# Altium integrated library Altium_WCAP-ATUL_rev19a.IntLib: 117 symbols
Pins are listed as number, name and electrical type; pins without a type are passive.

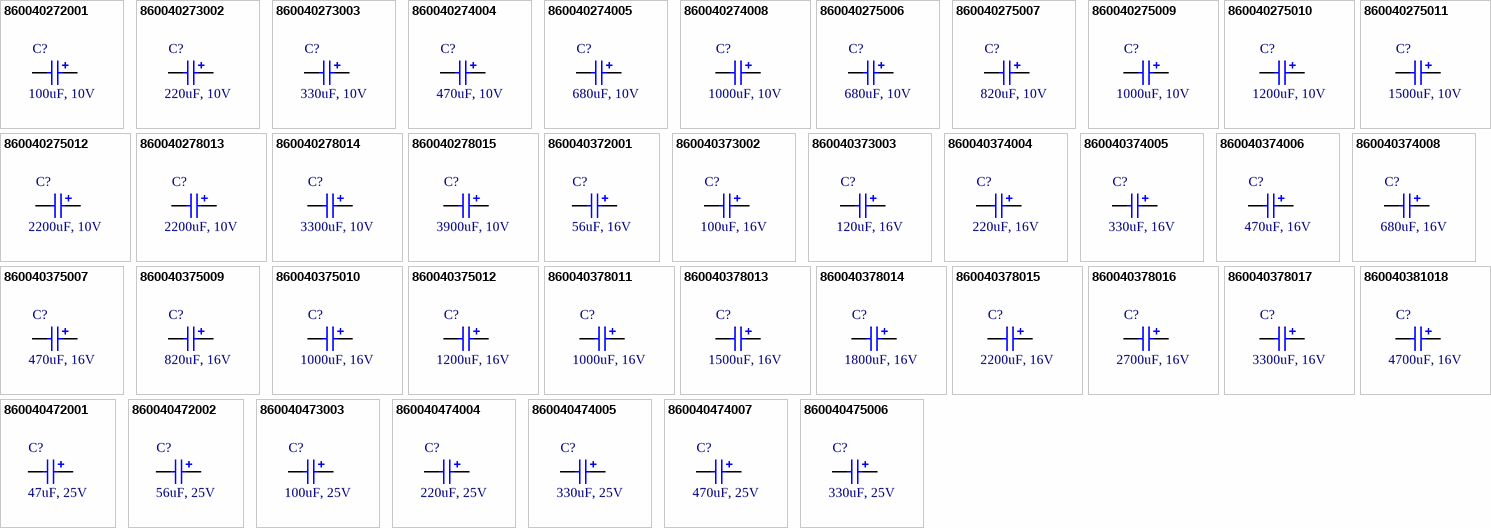
[diagram p0: symbols 860040272001 to 860040475006]

## 860040272001
designator C?, comment 100uF, 10V
WCAP-ATUL THT Aluminum Electrolytic Capacitors, D5mm x L11mm, 100uF, +/-20%, 10VDC; Part Number: 860040272001; Dissipation Factor: 19%; Endurance: 4000h; Leakage Current: 10uA; Ripple Current max.: 215mA; Technical Reference: ATDC110101M010DSPA3D000; ComponentLink1Description: Manufacturer; ComponentLink1URL: http://www.we-online.de; ComponentLink2Description: Datasheet; ComponentLink2URL: https://katalog.we-online.com/pbs/datasheet/860040272001.pdf; Length: 11mm; Mounting Technology: THT; Operating Temperature: -40 to +105degC; Packaging: Ammo Pack; Published Date: August 2019; Capacitance: 100uF; Diameter: 5mm; Publisher: Wurth Elektronik; Capacitance Tolerance: +/-20%; Rated Voltage: 10VDC
footprint WCAP-ATUL_5x11
pins: 1 N, 2 P

## 860040273002
designator C?, comment 220uF, 10V
WCAP-ATUL THT Aluminum Electrolytic Capacitors, D6.3mm x L11mm, 220uF, +/-20%, 10VDC; Part Number: 860040273002; Dissipation Factor: 19%; Endurance: 4000h; Leakage Current: 22uA; Ripple Current max.: 340mA; Technical Reference: ATDD110221M010DSPA4D000; ComponentLink1Description: Manufacturer; ComponentLink1URL: http://www.we-online.de; ComponentLink2Description: Datasheet; ComponentLink2URL: https://katalog.we-online.com/pbs/datasheet/860040273002.pdf; Length: 11mm; Mounting Technology: THT; Operating Temperature: -40 to +105degC; Packaging: Ammo Pack; Published Date: August 2019; Capacitance: 220uF; Diameter: 6.3mm; Publisher: Wurth Elektronik; Capacitance Tolerance: +/-20%; Rated Voltage: 10VDC
footprint WCAP-ATUL_6.3x11
pins: 1 N, 2 P

## 860040273003
designator C?, comment 330uF, 10V
WCAP-ATUL THT Aluminum Electrolytic Capacitors, D6.3mm x L11mm, 330uF, +/-20%, 10VDC; Part Number: 860040273003; Dissipation Factor: 19%; Endurance: 4000h; Leakage Current: 33uA; Ripple Current max.: 380mA; Technical Reference: ATDD110331M010DSPA4D000; ComponentLink1Description: Manufacturer; ComponentLink1URL: http://www.we-online.de; ComponentLink2Description: Datasheet; ComponentLink2URL: https://katalog.we-online.com/pbs/datasheet/860040273003.pdf; Length: 11mm; Mounting Technology: THT; Operating Temperature: -40 to +105degC; Packaging: Ammo Pack; Published Date: August 2019; Capacitance: 330uF; Diameter: 6.3mm; Publisher: Wurth Elektronik; Capacitance Tolerance: +/-20%; Rated Voltage: 10VDC
footprint WCAP-ATUL_6.3x11
pins: 1 N, 2 P

## 860040274004
designator C?, comment 470uF, 10V
WCAP-ATUL THT Aluminum Electrolytic Capacitors, D8mm x L11.5mm, 470uF, +/-20%, 10VDC; Part Number: 860040274004; Dissipation Factor: 19%; Endurance: 6000h; Leakage Current: 47uA; Ripple Current max.: 600mA; Technical Reference: ATDE115471M010DSPA7F000; ComponentLink1Description: Manufacturer; ComponentLink1URL: http://www.we-online.de; ComponentLink2Description: Datasheet; ComponentLink2URL: https://katalog.we-online.com/pbs/datasheet/860040274004.pdf; Length: 11.5mm; Mounting Technology: THT; Operating Temperature: -40 to +105degC; Packaging: Ammo Pack; Published Date: August 2019; Capacitance: 470uF; Diameter: 8mm; Publisher: Wurth Elektronik; Capacitance Tolerance: +/-20%; Rated Voltage: 10VDC
footprint WCAP-ATUL_8x11.5
pins: 1 N, 2 P

## 860040274005
designator C?, comment 680uF, 10V
WCAP-ATUL THT Aluminum Electrolytic Capacitors, D8mm x L16mm, 680uF, +/-20%, 10VDC; Part Number: 860040274005; Dissipation Factor: 19%; Endurance: 6000h; Leakage Current: 68uA; Ripple Current max.: 770mA; Technical Reference: ATDE160681M010DSPA7F000; ComponentLink1Description: Manufacturer; ComponentLink1URL: http://www.we-online.de; ComponentLink2Description: Datasheet; ComponentLink2URL: https://katalog.we-online.com/pbs/datasheet/860040274005.pdf; Length: 16mm; Mounting Technology: THT; Operating Temperature: -40 to +105degC; Packaging: Ammo Pack; Published Date: August 2019; Capacitance: 680uF; Diameter: 8mm; Publisher: Wurth Elektronik; Capacitance Tolerance: +/-20%; Rated Voltage: 10VDC
footprint WCAP-ATUL_8x16
pins: 1 N, 2 P

## 860040274008
designator C?, comment 1000uF, 10V
WCAP-ATUL THT Aluminum Electrolytic Capacitors, D8mm x L20mm, 1000uF, +/-20%, 10VDC; Part Number: 860040274008; Dissipation Factor: 19%; Endurance: 6000h; Leakage Current: 100uA; Ripple Current max.: 1050mA; Technical Reference: ATDE200102M010DSPA7F000; ComponentLink1Description: Manufacturer; ComponentLink1URL: http://www.we-online.de; ComponentLink2Description: Datasheet; ComponentLink2URL: https://katalog.we-online.com/pbs/datasheet/860040274008.pdf; Length: 20mm; Mounting Technology: THT; Operating Temperature: -40 to +105degC; Packaging: Ammo Pack; Published Date: August 2019; Capacitance: 1000uF; Diameter: 8mm; Publisher: Wurth Elektronik; Capacitance Tolerance: +/-20%; Rated Voltage: 10VDC
footprint WCAP-ATUL_8x20
pins: 1 N, 2 P

## 860040275006
designator C?, comment 680uF, 10V
WCAP-ATUL THT Aluminum Electrolytic Capacitors, D10mm x L12.5mm, 680uF, +/-20%, 10VDC; Part Number: 860040275006; Dissipation Factor: 19%; Endurance: 6000h; Leakage Current: 68uA; Ripple Current max.: 800mA; Technical Reference: ATDF125681M010DSPA9F000; ComponentLink1Description: Manufacturer; ComponentLink1URL: http://www.we-online.de; ComponentLink2Description: Datasheet; ComponentLink2URL: https://katalog.we-online.com/pbs/datasheet/860040275006.pdf; Length: 12.5mm; Mounting Technology: THT; Operating Temperature: -40 to +105degC; Packaging: Ammo Pack; Published Date: August 2019; Capacitance: 680uF; Diameter: 10mm; Publisher: Wurth Elektronik; Capacitance Tolerance: +/-20%; Rated Voltage: 10VDC
footprint WCAP-ATUL_10x12.5
pins: 1 N, 2 P

## 860040275007
designator C?, comment 820uF, 10V
WCAP-ATUL THT Aluminum Electrolytic Capacitors, D10mm x L16mm, 820uF, +/-20%, 10VDC; Part Number: 860040275007; Dissipation Factor: 19%; Endurance: 6000h; Leakage Current: 82uA; Ripple Current max.: 920mA; Technical Reference: ATDF160821M010DSPAAF000; ComponentLink1Description: Manufacturer; ComponentLink1URL: http://www.we-online.de; ComponentLink2Description: Datasheet; ComponentLink2URL: https://katalog.we-online.com/pbs/datasheet/860040275007.pdf; Length: 16mm; Mounting Technology: THT; Operating Temperature: -40 to +105degC; Packaging: Ammo Pack; Published Date: August 2019; Capacitance: 820uF; Diameter: 10mm; Publisher: Wurth Elektronik; Capacitance Tolerance: +/-20%; Rated Voltage: 10VDC
footprint WCAP-ATUL_10x16
pins: 1 N, 2 P

## 860040275009
designator C?, comment 1000uF, 10V
WCAP-ATUL THT Aluminum Electrolytic Capacitors, D10mm x L16mm, 1000uF, +/-20%, 10VDC; Part Number: 860040275009; Dissipation Factor: 19%; Endurance: 6000h; Leakage Current: 100uA; Ripple Current max.: 1110mA; Technical Reference: ATDF160102M010DSPAAF000; ComponentLink1Description: Manufacturer; ComponentLink1URL: http://www.we-online.de; ComponentLink2Description: Datasheet; ComponentLink2URL: https://katalog.we-online.com/pbs/datasheet/860040275009.pdf; Length: 16mm; Mounting Technology: THT; Operating Temperature: -40 to +105degC; Packaging: Ammo Pack; Published Date: August 2019; Capacitance: 1000uF; Diameter: 10mm; Publisher: Wurth Elektronik; Capacitance Tolerance: +/-20%; Rated Voltage: 10VDC
footprint WCAP-ATUL_10x16
pins: 1 N, 2 P

## 860040275010
designator C?, comment 1200uF, 10V
WCAP-ATUL THT Aluminum Electrolytic Capacitors, D10mm x L20mm, 1200uF, +/-20%, 10VDC; Part Number: 860040275010; Dissipation Factor: 19%; Endurance: 6000h; Leakage Current: 120uA; Ripple Current max.: 1380mA; Technical Reference: ATDF200122M010DSPAAF000; ComponentLink1Description: Manufacturer; ComponentLink1URL: http://www.we-online.de; ComponentLink2Description: Datasheet; ComponentLink2URL: https://katalog.we-online.com/pbs/datasheet/860040275010.pdf; Length: 20mm; Mounting Technology: THT; Operating Temperature: -40 to +105degC; Packaging: Ammo Pack; Published Date: August 2019; Capacitance: 1200uF; Diameter: 10mm; Publisher: Wurth Elektronik; Capacitance Tolerance: +/-20%; Rated Voltage: 10VDC
footprint WCAP-ATUL_10x20
pins: 1 N, 2 P

## 860040275011
designator C?, comment 1500uF, 10V
WCAP-ATUL THT Aluminum Electrolytic Capacitors, D10mm x L25mm, 1500uF, +/-20%, 10VDC; Part Number: 860040275011; Dissipation Factor: 19%; Endurance: 6000h; Leakage Current: 150uA; Ripple Current max.: 1550mA; Technical Reference: ATDF250152M010DSPAAF000; ComponentLink1Description: Manufacturer; ComponentLink1URL: http://www.we-online.de; ComponentLink2Description: Datasheet; ComponentLink2URL: https://katalog.we-online.com/pbs/datasheet/860040275011.pdf; Length: 25mm; Mounting Technology: THT; Operating Temperature: -40 to +105degC; Packaging: Ammo Pack; Published Date: August 2019; Capacitance: 1500uF; Diameter: 10mm; Publisher: Wurth Elektronik; Capacitance Tolerance: +/-20%; Rated Voltage: 10VDC
footprint WCAP-ATUL_10x25
pins: 1 N, 2 P

## 860040275012
designator C?, comment 2200uF, 10V
WCAP-ATUL THT Aluminum Electrolytic Capacitors, D10mm x L30mm, 2200uF, +/-20%, 10VDC; Part Number: 860040275012; Dissipation Factor: 21%; Endurance: 6000h; Leakage Current: 220uA; Ripple Current max.: 1880mA; Technical Reference: ATDF300222M010DSPAAF000; ComponentLink1Description: Manufacturer; ComponentLink1URL: http://www.we-online.de; ComponentLink2Description: Datasheet; ComponentLink2URL: https://katalog.we-online.com/pbs/datasheet/860040275012.pdf; Length: 30mm; Mounting Technology: THT; Operating Temperature: -40 to +105degC; Packaging: Ammo Pack; Published Date: August 2019; Capacitance: 2200uF; Diameter: 10mm; Publisher: Wurth Elektronik; Capacitance Tolerance: +/-20%; Rated Voltage: 10VDC
footprint WCAP-ATUL_10x30
pins: 1 N, 2 P

## 860040278013
designator C?, comment 2200uF, 10V
WCAP-ATUL THT Aluminum Electrolytic Capacitors, D13mm x L20mm, 2200uF, +/-20%, 10VDC; Part Number: 860040278013; Dissipation Factor: 21%; Endurance: 8000h; Leakage Current: 220uA; Ripple Current max.: 1800mA; Technical Reference: ATDI200222M010DSPACH000; ComponentLink1Description: Manufacturer; ComponentLink1URL: http://www.we-online.de; ComponentLink2Description: Datasheet; ComponentLink2URL: https://katalog.we-online.com/pbs/datasheet/860040278013.pdf; Length: 20mm; Mounting Technology: THT; Operating Temperature: -40 to +105degC; Packaging: Ammo Pack; Published Date: August 2019; Capacitance: 2200uF; Diameter: 13mm; Publisher: Wurth Elektronik; Capacitance Tolerance: +/-20%; Rated Voltage: 10VDC
footprint WCAP-ATUL_13x20
pins: 1 N, 2 P

## 860040278014
designator C?, comment 3300uF, 10V
WCAP-ATUL THT Aluminum Electrolytic Capacitors, D13mm x L25mm, 3300uF, +/-20%, 10VDC; Part Number: 860040278014; Dissipation Factor: 23%; Endurance: 8000h; Leakage Current: 330uA; Ripple Current max.: 2120mA; Technical Reference: ATDI250332M010DSPACH000; ComponentLink1Description: Manufacturer; ComponentLink1URL: http://www.we-online.de; ComponentLink2Description: Datasheet; ComponentLink2URL: https://katalog.we-online.com/pbs/datasheet/860040278014.pdf; Length: 25mm; Mounting Technology: THT; Operating Temperature: -40 to +105degC; Packaging: Ammo Pack; Published Date: August 2019; Capacitance: 3300uF; Diameter: 13mm; Publisher: Wurth Elektronik; Capacitance Tolerance: +/-20%; Rated Voltage: 10VDC
footprint WCAP-ATUL_13x25
pins: 1 N, 2 P

## 860040278015
designator C?, comment 3900uF, 10V
WCAP-ATUL THT Aluminum Electrolytic Capacitors, D13mm x L30mm, 3900uF, +/-20%, 10VDC; Part Number: 860040278015; Dissipation Factor: 23%; Endurance: 8000h; Leakage Current: 390uA; Ripple Current max.: 2400mA; Technical Reference: ATDI300392M010DSPACH000; ComponentLink1Description: Manufacturer; ComponentLink1URL: http://www.we-online.de; ComponentLink2Description: Datasheet; ComponentLink2URL: https://katalog.we-online.com/pbs/datasheet/860040278015.pdf; Length: 30mm; Mounting Technology: THT; Operating Temperature: -40 to +105degC; Packaging: Ammo Pack; Published Date: August 2019; Capacitance: 3900uF; Diameter: 13mm; Publisher: Wurth Elektronik; Capacitance Tolerance: +/-20%; Rated Voltage: 10VDC
footprint WCAP-ATUL_13x30
pins: 1 N, 2 P

## 860040372001
designator C?, comment 56uF, 16V
WCAP-ATUL THT Aluminum Electrolytic Capacitors, D5mm x L11mm, 56uF, +/-20%, 16VDC; Part Number: 860040372001; Dissipation Factor: 16%; Endurance: 5000h; Leakage Current: 8.96uA; Ripple Current max.: 200mA; Technical Reference: ATDC110560M016DSPA3E000; ComponentLink1Description: Manufacturer; ComponentLink1URL: http://www.we-online.de; ComponentLink2Description: Datasheet; ComponentLink2URL: https://katalog.we-online.com/pbs/datasheet/860040372001.pdf; Length: 11mm; Mounting Technology: THT; Operating Temperature: -40 to +105degC; Packaging: Ammo Pack; Published Date: August 2019; Capacitance: 56uF; Diameter: 5mm; Publisher: Wurth Elektronik; Capacitance Tolerance: +/-20%; Rated Voltage: 16VDC
footprint WCAP-ATUL_5x11
pins: 1 N, 2 P

## 860040373002
designator C?, comment 100uF, 16V
WCAP-ATUL THT Aluminum Electrolytic Capacitors, D6.3mm x L11mm, 100uF, +/-20%, 16VDC; Part Number: 860040373002; Dissipation Factor: 16%; Endurance: 5000h; Leakage Current: 16uA; Ripple Current max.: 280mA; Technical Reference: ATDD110101M016DSPA4E000; ComponentLink1Description: Manufacturer; ComponentLink1URL: http://www.we-online.de; ComponentLink2Description: Datasheet; ComponentLink2URL: https://katalog.we-online.com/pbs/datasheet/860040373002.pdf; Length: 11mm; Mounting Technology: THT; Operating Temperature: -40 to +105degC; Packaging: Ammo Pack; Published Date: August 2019; Capacitance: 100uF; Diameter: 6.3mm; Publisher: Wurth Elektronik; Capacitance Tolerance: +/-20%; Rated Voltage: 16VDC
footprint WCAP-ATUL_6.3x11
pins: 1 N, 2 P

## 860040373003
designator C?, comment 120uF, 16V
WCAP-ATUL THT Aluminum Electrolytic Capacitors, D6.3mm x L11mm, 120uF, +/-20%, 16VDC; Part Number: 860040373003; Dissipation Factor: 16%; Endurance: 5000h; Leakage Current: 19.2uA; Ripple Current max.: 310mA; Technical Reference: ATDD110121M016DSPA4E000; ComponentLink1Description: Manufacturer; ComponentLink1URL: http://www.we-online.de; ComponentLink2Description: Datasheet; ComponentLink2URL: https://katalog.we-online.com/pbs/datasheet/860040373003.pdf; Length: 11mm; Mounting Technology: THT; Operating Temperature: -40 to +105degC; Packaging: Ammo Pack; Published Date: August 2019; Capacitance: 120uF; Diameter: 6.3mm; Publisher: Wurth Elektronik; Capacitance Tolerance: +/-20%; Rated Voltage: 16VDC
footprint WCAP-ATUL_6.3x11
pins: 1 N, 2 P

## 860040374004
designator C?, comment 220uF, 16V
WCAP-ATUL THT Aluminum Electrolytic Capacitors, D8mm x L11.5mm, 220uF, +/-20%, 16VDC; Part Number: 860040374004; Dissipation Factor: 16%; Endurance: 7000h; Leakage Current: 35.2uA; Ripple Current max.: 480mA; Technical Reference: ATDE115221M016DSPA7G000; ComponentLink1Description: Manufacturer; ComponentLink1URL: http://www.we-online.de; ComponentLink2Description: Datasheet; ComponentLink2URL: https://katalog.we-online.com/pbs/datasheet/860040374004.pdf; Length: 11.5mm; Mounting Technology: THT; Operating Temperature: -40 to +105degC; Packaging: Ammo Pack; Published Date: August 2019; Capacitance: 220uF; Diameter: 8mm; Publisher: Wurth Elektronik; Capacitance Tolerance: +/-20%; Rated Voltage: 16VDC
footprint WCAP-ATUL_8x11.5
pins: 1 N, 2 P

## 860040374005
designator C?, comment 330uF, 16V
WCAP-ATUL THT Aluminum Electrolytic Capacitors, D8mm x L11.5mm, 330uF, +/-20%, 16VDC; Part Number: 860040374005; Dissipation Factor: 16%; Endurance: 7000h; Leakage Current: 52.8uA; Ripple Current max.: 600mA; Technical Reference: ATDE115331M016DSPA7G000; ComponentLink1Description: Manufacturer; ComponentLink1URL: http://www.we-online.de; ComponentLink2Description: Datasheet; ComponentLink2URL: https://katalog.we-online.com/pbs/datasheet/860040374005.pdf; Length: 11.5mm; Mounting Technology: THT; Operating Temperature: -40 to +105degC; Packaging: Ammo Pack; Published Date: August 2019; Capacitance: 330uF; Diameter: 8mm; Publisher: Wurth Elektronik; Capacitance Tolerance: +/-20%; Rated Voltage: 16VDC
footprint WCAP-ATUL_8x11.5
pins: 1 N, 2 P

## 860040374006
designator C?, comment 470uF, 16V
WCAP-ATUL THT Aluminum Electrolytic Capacitors, D8mm x L16mm, 470uF, +/-20%, 16VDC; Part Number: 860040374006; Dissipation Factor: 16%; Endurance: 7000h; Leakage Current: 75.2uA; Ripple Current max.: 780mA; Technical Reference: ATDE160471M016DSPA7G000; ComponentLink1Description: Manufacturer; ComponentLink1URL: http://www.we-online.de; ComponentLink2Description: Datasheet; ComponentLink2URL: https://katalog.we-online.com/pbs/datasheet/860040374006.pdf; Length: 16mm; Mounting Technology: THT; Operating Temperature: -40 to +105degC; Packaging: Ammo Pack; Published Date: August 2019; Capacitance: 470uF; Diameter: 8mm; Publisher: Wurth Elektronik; Capacitance Tolerance: +/-20%; Rated Voltage: 16VDC
footprint WCAP-ATUL_8x16
pins: 1 N, 2 P

## 860040374008
designator C?, comment 680uF, 16V
WCAP-ATUL THT Aluminum Electrolytic Capacitors, D8mm x L20mm, 680uF, +/-20%, 16VDC; Part Number: 860040374008; Dissipation Factor: 16%; Endurance: 7000h; Leakage Current: 108.8uA; Ripple Current max.: 1000mA; Technical Reference: ATDE200681M016DSPA7G000; ComponentLink1Description: Manufacturer; ComponentLink1URL: http://www.we-online.de; ComponentLink2Description: Datasheet; ComponentLink2URL: https://katalog.we-online.com/pbs/datasheet/860040374008.pdf; Length: 20mm; Mounting Technology: THT; Operating Temperature: -40 to +105degC; Packaging: Ammo Pack; Published Date: August 2019; Capacitance: 680uF; Diameter: 8mm; Publisher: Wurth Elektronik; Capacitance Tolerance: +/-20%; Rated Voltage: 16VDC
footprint WCAP-ATUL_8x20
pins: 1 N, 2 P

## 860040375007
designator C?, comment 470uF, 16V
WCAP-ATUL THT Aluminum Electrolytic Capacitors, D10mm x L12.5mm, 470uF, +/-20%, 16VDC; Part Number: 860040375007; Dissipation Factor: 16%; Endurance: 7000h; Leakage Current: 75.2uA; Ripple Current max.: 800mA; Technical Reference: ATDF125471M016DSPA9G000; ComponentLink1Description: Manufacturer; ComponentLink1URL: http://www.we-online.de; ComponentLink2Description: Datasheet; ComponentLink2URL: https://katalog.we-online.com/pbs/datasheet/860040375007.pdf; Length: 12.5mm; Mounting Technology: THT; Operating Temperature: -40 to +105degC; Packaging: Ammo Pack; Published Date: August 2019; Capacitance: 470uF; Diameter: 10mm; Publisher: Wurth Elektronik; Capacitance Tolerance: +/-20%; Rated Voltage: 16VDC
footprint WCAP-ATUL_10x12.5
pins: 1 N, 2 P

## 860040375009
designator C?, comment 820uF, 16V
WCAP-ATUL THT Aluminum Electrolytic Capacitors, D10mm x L20mm, 820uF, +/-20%, 16VDC; Part Number: 860040375009; Dissipation Factor: 16%; Endurance: 7000h; Leakage Current: 131.2uA; Ripple Current max.: 1280mA; Technical Reference: ATDF200821M016DSPAAG000; ComponentLink1Description: Manufacturer; ComponentLink1URL: http://www.we-online.de; ComponentLink2Description: Datasheet; ComponentLink2URL: https://katalog.we-online.com/pbs/datasheet/860040375009.pdf; Length: 20mm; Mounting Technology: THT; Operating Temperature: -40 to +105degC; Packaging: Ammo Pack; Published Date: August 2019; Capacitance: 820uF; Diameter: 10mm; Publisher: Wurth Elektronik; Capacitance Tolerance: +/-20%; Rated Voltage: 16VDC
footprint WCAP-ATUL_10x20
pins: 1 N, 2 P

## 860040375010
designator C?, comment 1000uF, 16V
WCAP-ATUL THT Aluminum Electrolytic Capacitors, D10mm x L20mm, 1000uF, +/-20%, 16VDC; Part Number: 860040375010; Dissipation Factor: 16%; Endurance: 7000h; Leakage Current: 160uA; Ripple Current max.: 1380mA; Technical Reference: ATDF200102M016DSPAAG000; ComponentLink1Description: Manufacturer; ComponentLink1URL: http://www.we-online.de; ComponentLink2Description: Datasheet; ComponentLink2URL: https://katalog.we-online.com/pbs/datasheet/860040375010.pdf; Length: 20mm; Mounting Technology: THT; Operating Temperature: -40 to +105degC; Packaging: Ammo Pack; Published Date: August 2019; Capacitance: 1000uF; Diameter: 10mm; Publisher: Wurth Elektronik; Capacitance Tolerance: +/-20%; Rated Voltage: 16VDC
footprint WCAP-ATUL_10x20
pins: 1 N, 2 P

## 860040375012
designator C?, comment 1200uF, 16V
WCAP-ATUL THT Aluminum Electrolytic Capacitors, D10mm x L25mm, 1200uF, +/-20%, 16VDC; Part Number: 860040375012; Dissipation Factor: 16%; Endurance: 7000h; Leakage Current: 192uA; Ripple Current max.: 1560mA; Technical Reference: ATDF250122M016DSPAAG000; ComponentLink1Description: Manufacturer; ComponentLink1URL: http://www.we-online.de; ComponentLink2Description: Datasheet; ComponentLink2URL: https://katalog.we-online.com/pbs/datasheet/860040375012.pdf; Length: 25mm; Mounting Technology: THT; Operating Temperature: -40 to +105degC; Packaging: Ammo Pack; Published Date: August 2019; Capacitance: 1200uF; Diameter: 10mm; Publisher: Wurth Elektronik; Capacitance Tolerance: +/-20%; Rated Voltage: 16VDC
footprint WCAP-ATUL_10x25
pins: 1 N, 2 P

## 860040378011
designator C?, comment 1000uF, 16V
WCAP-ATUL THT Aluminum Electrolytic Capacitors, D13mm x L16mm, 1000uF, +/-20%, 16VDC; Part Number: 860040378011; Dissipation Factor: 16%; Endurance: 10000h; Leakage Current: 160uA; Ripple Current max.: 1420mA; Technical Reference: ATDI160102M016DSPACK000; ComponentLink1Description: Manufacturer; ComponentLink1URL: http://www.we-online.de; ComponentLink2Description: Datasheet; ComponentLink2URL: https://katalog.we-online.com/pbs/datasheet/860040378011.pdf; Length: 16mm; Mounting Technology: THT; Operating Temperature: -40 to +105degC; Packaging: Ammo Pack; Published Date: August 2019; Capacitance: 1000uF; Diameter: 13mm; Publisher: Wurth Elektronik; Capacitance Tolerance: +/-20%; Rated Voltage: 16VDC
footprint WCAP-ATUL_13x16
pins: 1 N, 2 P

## 860040378013
designator C?, comment 1500uF, 16V
WCAP-ATUL THT Aluminum Electrolytic Capacitors, D13mm x L20mm, 1500uF, +/-20%, 16VDC; Part Number: 860040378013; Dissipation Factor: 16%; Endurance: 10000h; Leakage Current: 240uA; Ripple Current max.: 1720mA; Technical Reference: ATDI200152M016DSPACK000; ComponentLink1Description: Manufacturer; ComponentLink1URL: http://www.we-online.de; ComponentLink2Description: Datasheet; ComponentLink2URL: https://katalog.we-online.com/pbs/datasheet/860040378013.pdf; Length: 20mm; Mounting Technology: THT; Operating Temperature: -40 to +105degC; Packaging: Ammo Pack; Published Date: August 2019; Capacitance: 1500uF; Diameter: 13mm; Publisher: Wurth Elektronik; Capacitance Tolerance: +/-20%; Rated Voltage: 16VDC
footprint WCAP-ATUL_13x20
pins: 1 N, 2 P

## 860040378014
designator C?, comment 1800uF, 16V
WCAP-ATUL THT Aluminum Electrolytic Capacitors, D13mm x L25mm, 1800uF, +/-20%, 16VDC; Part Number: 860040378014; Dissipation Factor: 16%; Endurance: 10000h; Leakage Current: 288uA; Ripple Current max.: 2030mA; Technical Reference: ATDI250182M016DSPACK000; ComponentLink1Description: Manufacturer; ComponentLink1URL: http://www.we-online.de; ComponentLink2Description: Datasheet; ComponentLink2URL: https://katalog.we-online.com/pbs/datasheet/860040378014.pdf; Length: 25mm; Mounting Technology: THT; Operating Temperature: -40 to +105degC; Packaging: Ammo Pack; Published Date: August 2019; Capacitance: 1800uF; Diameter: 13mm; Publisher: Wurth Elektronik; Capacitance Tolerance: +/-20%; Rated Voltage: 16VDC
footprint WCAP-ATUL_13x25
pins: 1 N, 2 P

## 860040378015
designator C?, comment 2200uF, 16V
WCAP-ATUL THT Aluminum Electrolytic Capacitors, D13mm x L25mm, 2200uF, +/-20%, 16VDC; Part Number: 860040378015; Dissipation Factor: 18%; Endurance: 10000h; Leakage Current: 352uA; Ripple Current max.: 2200mA; Technical Reference: ATDI250222M016DSPACK000; ComponentLink1Description: Manufacturer; ComponentLink1URL: http://www.we-online.de; ComponentLink2Description: Datasheet; ComponentLink2URL: https://katalog.we-online.com/pbs/datasheet/860040378015.pdf; Length: 25mm; Mounting Technology: THT; Operating Temperature: -40 to +105degC; Packaging: Ammo Pack; Published Date: August 2019; Capacitance: 2200uF; Diameter: 13mm; Publisher: Wurth Elektronik; Capacitance Tolerance: +/-20%; Rated Voltage: 16VDC
footprint WCAP-ATUL_13x25
pins: 1 N, 2 P

## 860040378016
designator C?, comment 2700uF, 16V
WCAP-ATUL THT Aluminum Electrolytic Capacitors, D13mm x L30mm, 2700uF, +/-20%, 16VDC; Part Number: 860040378016; Dissipation Factor: 18%; Endurance: 10000h; Leakage Current: 432uA; Ripple Current max.: 2600mA; Technical Reference: ATDI300272M016DSPACK000; ComponentLink1Description: Manufacturer; ComponentLink1URL: http://www.we-online.de; ComponentLink2Description: Datasheet; ComponentLink2URL: https://katalog.we-online.com/pbs/datasheet/860040378016.pdf; Length: 30mm; Mounting Technology: THT; Operating Temperature: -40 to +105degC; Packaging: Ammo Pack; Published Date: August 2019; Capacitance: 2700uF; Diameter: 13mm; Publisher: Wurth Elektronik; Capacitance Tolerance: +/-20%; Rated Voltage: 16VDC
footprint WCAP-ATUL_13x30
pins: 1 N, 2 P

## 860040378017
designator C?, comment 3300uF, 16V
WCAP-ATUL THT Aluminum Electrolytic Capacitors, D13mm x L35mm, 3300uF, +/-20%, 16VDC; Part Number: 860040378017; Dissipation Factor: 20%; Endurance: 10000h; Leakage Current: 528uA; Ripple Current max.: 2860mA; Technical Reference: ATDI350332M016DSPABK000; ComponentLink1Description: Manufacturer; ComponentLink1URL: http://www.we-online.de; ComponentLink2Description: Datasheet; ComponentLink2URL: https://katalog.we-online.com/pbs/datasheet/860040378017.pdf; Length: 35mm; Mounting Technology: THT; Operating Temperature: -40 to +105degC; Packaging: Ammo Pack; Published Date: August 2019; Capacitance: 3300uF; Diameter: 13mm; Publisher: Wurth Elektronik; Capacitance Tolerance: +/-20%; Rated Voltage: 16VDC
footprint WCAP-ATUL_13x35
pins: 1 N, 2 P

## 860040381018
designator C?, comment 4700uF, 16V
WCAP-ATUL THT Aluminum Electrolytic Capacitors, D18mm x L25mm, 4700uF, +/-20%, 16VDC; Part Number: 860040381018; Dissipation Factor: 22%; Endurance: 10000h; Leakage Current: 752uA; Ripple Current max.: 3000mA; Technical Reference: ATDL250472M016DSPAEK000; ComponentLink1Description: Manufacturer; ComponentLink1URL: http://www.we-online.de; ComponentLink2Description: Datasheet; ComponentLink2URL: https://katalog.we-online.com/pbs/datasheet/860040381018.pdf; Length: 25mm; Mounting Technology: THT; Operating Temperature: -40 to +105degC; Packaging: Ammo Pack; Published Date: August 2019; Capacitance: 4700uF; Diameter: 18mm; Publisher: Wurth Elektronik; Capacitance Tolerance: +/-20%; Rated Voltage: 16VDC
footprint WCAP-ATUL_18x25
pins: 1 N, 2 P

## 860040472001
designator C?, comment 47uF, 25V
WCAP-ATUL THT Aluminum Electrolytic Capacitors, D5mm x L11mm, 47uF, +/-20%, 25VDC; Part Number: 860040472001; Dissipation Factor: 14%; Endurance: 5000h; Leakage Current: 11.75uA; Ripple Current max.: 160mA; Technical Reference: ATDC110470M025DSPA3E000; ComponentLink1Description: Manufacturer; ComponentLink1URL: http://www.we-online.de; ComponentLink2Description: Datasheet; ComponentLink2URL: https://katalog.we-online.com/pbs/datasheet/860040472001.pdf; Length: 11mm; Mounting Technology: THT; Operating Temperature: -40 to +105degC; Packaging: Ammo Pack; Published Date: August 2019; Capacitance: 47uF; Diameter: 5mm; Publisher: Wurth Elektronik; Capacitance Tolerance: +/-20%; Rated Voltage: 25VDC
footprint WCAP-ATUL_5x11
pins: 1 N, 2 P

## 860040472002
designator C?, comment 56uF, 25V
WCAP-ATUL THT Aluminum Electrolytic Capacitors, D5mm x L11mm, 56uF, +/-20%, 25VDC; Part Number: 860040472002; Dissipation Factor: 14%; Endurance: 5000h; Leakage Current: 14uA; Ripple Current max.: 240mA; Technical Reference: ATDC110560M025DSPA3E000; ComponentLink1Description: Manufacturer; ComponentLink1URL: http://www.we-online.de; ComponentLink2Description: Datasheet; ComponentLink2URL: https://katalog.we-online.com/pbs/datasheet/860040472002.pdf; Length: 11mm; Mounting Technology: THT; Operating Temperature: -40 to +105degC; Packaging: Ammo Pack; Published Date: August 2019; Capacitance: 56uF; Diameter: 5mm; Publisher: Wurth Elektronik; Capacitance Tolerance: +/-20%; Rated Voltage: 25VDC
footprint WCAP-ATUL_5x11
pins: 1 N, 2 P

## 860040473003
designator C?, comment 100uF, 25V
WCAP-ATUL THT Aluminum Electrolytic Capacitors, D6.3mm x L11mm, 100uF, +/-20%, 25VDC; Part Number: 860040473003; Dissipation Factor: 14%; Endurance: 5000h; Leakage Current: 25uA; Ripple Current max.: 350mA; Technical Reference: ATDD110101M025DSPA4E000; ComponentLink1Description: Manufacturer; ComponentLink1URL: http://www.we-online.de; ComponentLink2Description: Datasheet; ComponentLink2URL: https://katalog.we-online.com/pbs/datasheet/860040473003.pdf; Length: 11mm; Mounting Technology: THT; Operating Temperature: -40 to +105degC; Packaging: Ammo Pack; Published Date: August 2019; Capacitance: 100uF; Diameter: 6.3mm; Publisher: Wurth Elektronik; Capacitance Tolerance: +/-20%; Rated Voltage: 25VDC
footprint WCAP-ATUL_6.3x11
pins: 1 N, 2 P

## 860040474004
designator C?, comment 220uF, 25V
WCAP-ATUL THT Aluminum Electrolytic Capacitors, D8mm x L11.5mm, 220uF, +/-20%, 25VDC; Part Number: 860040474004; Dissipation Factor: 14%; Endurance: 7000h; Leakage Current: 55uA; Ripple Current max.: 590mA; Technical Reference: ATDE115221M025DSPA7G000; ComponentLink1Description: Manufacturer; ComponentLink1URL: http://www.we-online.de; ComponentLink2Description: Datasheet; ComponentLink2URL: https://katalog.we-online.com/pbs/datasheet/860040474004.pdf; Length: 11.5mm; Mounting Technology: THT; Operating Temperature: -40 to +105degC; Packaging: Ammo Pack; Published Date: August 2019; Capacitance: 220uF; Diameter: 8mm; Publisher: Wurth Elektronik; Capacitance Tolerance: +/-20%; Rated Voltage: 25VDC
footprint WCAP-ATUL_8x11.5
pins: 1 N, 2 P

## 860040474005
designator C?, comment 330uF, 25V
WCAP-ATUL THT Aluminum Electrolytic Capacitors, D8mm x L16mm, 330uF, +/-20%, 25VDC; Part Number: 860040474005; Dissipation Factor: 14%; Endurance: 7000h; Leakage Current: 82.5uA; Ripple Current max.: 810mA; Technical Reference: ATDE160331M025DSPA7G000; ComponentLink1Description: Manufacturer; ComponentLink1URL: http://www.we-online.de; ComponentLink2Description: Datasheet; ComponentLink2URL: https://katalog.we-online.com/pbs/datasheet/860040474005.pdf; Length: 16mm; Mounting Technology: THT; Operating Temperature: -40 to +105degC; Packaging: Ammo Pack; Published Date: August 2019; Capacitance: 330uF; Diameter: 8mm; Publisher: Wurth Elektronik; Capacitance Tolerance: +/-20%; Rated Voltage: 25VDC
footprint WCAP-ATUL_8x16
pins: 1 N, 2 P

## 860040474007
designator C?, comment 470uF, 25V
WCAP-ATUL THT Aluminum Electrolytic Capacitors, D8mm x L20mm, 470uF, +/-20%, 25VDC; Part Number: 860040474007; Dissipation Factor: 14%; Endurance: 7000h; Leakage Current: 117.5uA; Ripple Current max.: 1020mA; Technical Reference: ATDE200471M025DSPA7G000; ComponentLink1Description: Manufacturer; ComponentLink1URL: http://www.we-online.de; ComponentLink2Description: Datasheet; ComponentLink2URL: https://katalog.we-online.com/pbs/datasheet/860040474007.pdf; Length: 20mm; Mounting Technology: THT; Operating Temperature: -40 to +105degC; Packaging: Ammo Pack; Published Date: August 2019; Capacitance: 470uF; Diameter: 8mm; Publisher: Wurth Elektronik; Capacitance Tolerance: +/-20%; Rated Voltage: 25VDC
footprint WCAP-ATUL_8x20
pins: 1 N, 2 P

## 860040475006
designator C?, comment 330uF, 25V
WCAP-ATUL THT Aluminum Electrolytic Capacitors, D10mm x L12.5mm, 330uF, +/-20%, 25VDC; Part Number: 860040475006; Dissipation Factor: 14%; Endurance: 7000h; Leakage Current: 82.5uA; Ripple Current max.: 826mA; Technical Reference: ATDF125331M025DSPA9G000; ComponentLink1Description: Manufacturer; ComponentLink1URL: http://www.we-online.de; ComponentLink2Description: Datasheet; ComponentLink2URL: https://katalog.we-online.com/pbs/datasheet/860040475006.pdf; Length: 12.5mm; Mounting Technology: THT; Operating Temperature: -40 to +105degC; Packaging: Ammo Pack; Published Date: August 2019; Capacitance: 330uF; Diameter: 10mm; Publisher: Wurth Elektronik; Capacitance Tolerance: +/-20%; Rated Voltage: 25VDC
footprint WCAP-ATUL_10x12.5
pins: 1 N, 2 P

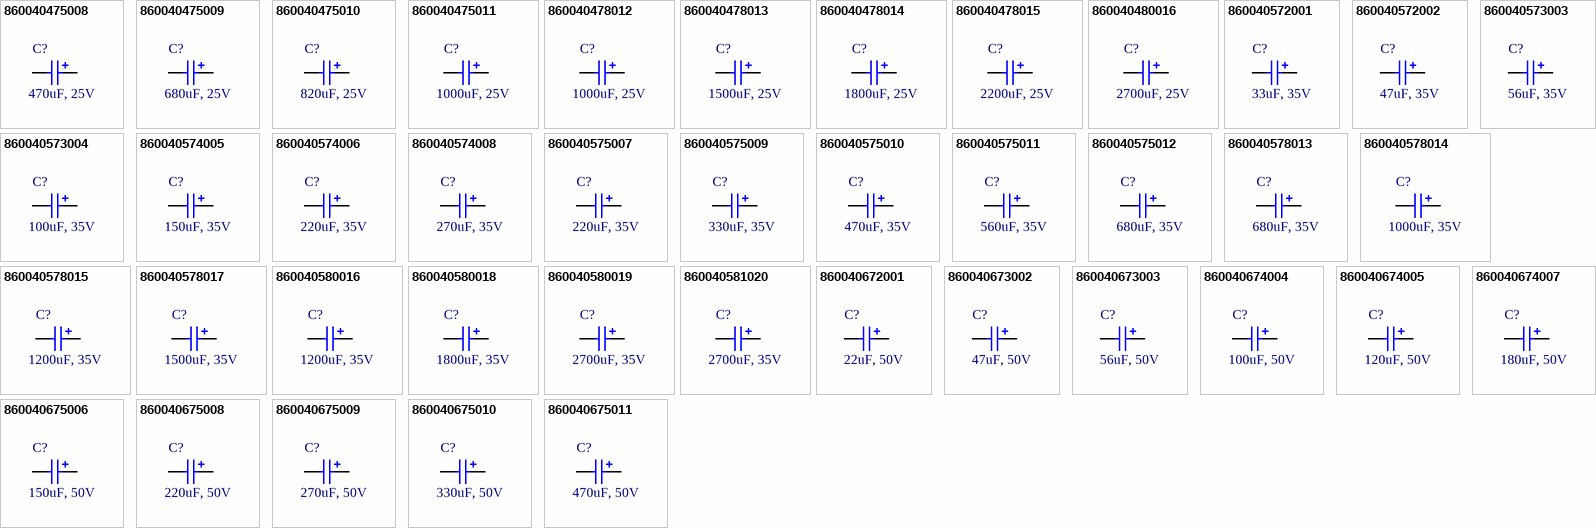
[diagram p1: symbols 860040475008 to 860040675011]

## 860040475008
designator C?, comment 470uF, 25V
WCAP-ATUL THT Aluminum Electrolytic Capacitors, D10mm x L16mm, 470uF, +/-20%, 25VDC; Part Number: 860040475008; Dissipation Factor: 14%; Endurance: 7000h; Leakage Current: 117.5uA; Ripple Current max.: 1210mA; Technical Reference: ATDF160471M025DSPAAG000; ComponentLink1Description: Manufacturer; ComponentLink1URL: http://www.we-online.de; ComponentLink2Description: Datasheet; ComponentLink2URL: https://katalog.we-online.com/pbs/datasheet/860040475008.pdf; Length: 16mm; Mounting Technology: THT; Operating Temperature: -40 to +105degC; Packaging: Ammo Pack; Published Date: August 2019; Capacitance: 470uF; Diameter: 10mm; Publisher: Wurth Elektronik; Capacitance Tolerance: +/-20%; Rated Voltage: 25VDC
footprint WCAP-ATUL_10x16
pins: 1 N, 2 P

## 860040475009
designator C?, comment 680uF, 25V
WCAP-ATUL THT Aluminum Electrolytic Capacitors, D10mm x L20mm, 680uF, +/-20%, 25VDC; Part Number: 860040475009; Dissipation Factor: 14%; Endurance: 7000h; Leakage Current: 170uA; Ripple Current max.: 1400mA; Technical Reference: ATDF200681M025DSPAAG000; ComponentLink1Description: Manufacturer; ComponentLink1URL: http://www.we-online.de; ComponentLink2Description: Datasheet; ComponentLink2URL: https://katalog.we-online.com/pbs/datasheet/860040475009.pdf; Length: 20mm; Mounting Technology: THT; Operating Temperature: -40 to +105degC; Packaging: Ammo Pack; Published Date: August 2019; Capacitance: 680uF; Diameter: 10mm; Publisher: Wurth Elektronik; Capacitance Tolerance: +/-20%; Rated Voltage: 25VDC
footprint WCAP-ATUL_10x20
pins: 1 N, 2 P

## 860040475010
designator C?, comment 820uF, 25V
WCAP-ATUL THT Aluminum Electrolytic Capacitors, D10mm x L25mm, 820uF, +/-20%, 25VDC; Part Number: 860040475010; Dissipation Factor: 14%; Endurance: 7000h; Leakage Current: 205uA; Ripple Current max.: 1580mA; Technical Reference: ATDF250821M025DSPAAG000; ComponentLink1Description: Manufacturer; ComponentLink1URL: http://www.we-online.de; ComponentLink2Description: Datasheet; ComponentLink2URL: https://katalog.we-online.com/pbs/datasheet/860040475010.pdf; Length: 25mm; Mounting Technology: THT; Operating Temperature: -40 to +105degC; Packaging: Ammo Pack; Published Date: August 2019; Capacitance: 820uF; Diameter: 10mm; Publisher: Wurth Elektronik; Capacitance Tolerance: +/-20%; Rated Voltage: 25VDC
footprint WCAP-ATUL_10x25
pins: 1 N, 2 P

## 860040475011
designator C?, comment 1000uF, 25V
WCAP-ATUL THT Aluminum Electrolytic Capacitors, D10mm x L30mm, 1000uF, +/-20%, 25VDC; Part Number: 860040475011; Dissipation Factor: 14%; Endurance: 7000h; Leakage Current: 250uA; Ripple Current max.: 1820mA; Technical Reference: ATDF300102M025DSPAAG000; ComponentLink1Description: Manufacturer; ComponentLink1URL: http://www.we-online.de; ComponentLink2Description: Datasheet; ComponentLink2URL: https://katalog.we-online.com/pbs/datasheet/860040475011.pdf; Length: 30mm; Mounting Technology: THT; Operating Temperature: -40 to +105degC; Packaging: Ammo Pack; Published Date: August 2019; Capacitance: 1000uF; Diameter: 10mm; Publisher: Wurth Elektronik; Capacitance Tolerance: +/-20%; Rated Voltage: 25VDC
footprint WCAP-ATUL_10x30
pins: 1 N, 2 P

## 860040478012
designator C?, comment 1000uF, 25V
WCAP-ATUL THT Aluminum Electrolytic Capacitors, D13mm x L20mm, 1000uF, +/-20%, 25VDC; Part Number: 860040478012; Dissipation Factor: 14%; Endurance: 10000h; Leakage Current: 250uA; Ripple Current max.: 1800mA; Technical Reference: ATDI200102M025DSPACK000; ComponentLink1Description: Manufacturer; ComponentLink1URL: http://www.we-online.de; ComponentLink2Description: Datasheet; ComponentLink2URL: https://katalog.we-online.com/pbs/datasheet/860040478012.pdf; Length: 20mm; Mounting Technology: THT; Operating Temperature: -40 to +105degC; Packaging: Ammo Pack; Published Date: August 2019; Capacitance: 1000uF; Diameter: 13mm; Publisher: Wurth Elektronik; Capacitance Tolerance: +/-20%; Rated Voltage: 25VDC
footprint WCAP-ATUL_13x20
pins: 1 N, 2 P

## 860040478013
designator C?, comment 1500uF, 25V
WCAP-ATUL THT Aluminum Electrolytic Capacitors, D13mm x L25mm, 1500uF, +/-20%, 25VDC; Part Number: 860040478013; Dissipation Factor: 14%; Endurance: 10000h; Leakage Current: 375uA; Ripple Current max.: 2240mA; Technical Reference: ATDI250152M025DSPACK000; ComponentLink1Description: Manufacturer; ComponentLink1URL: http://www.we-online.de; ComponentLink2Description: Datasheet; ComponentLink2URL: https://katalog.we-online.com/pbs/datasheet/860040478013.pdf; Length: 25mm; Mounting Technology: THT; Operating Temperature: -40 to +105degC; Packaging: Ammo Pack; Published Date: August 2019; Capacitance: 1500uF; Diameter: 13mm; Publisher: Wurth Elektronik; Capacitance Tolerance: +/-20%; Rated Voltage: 25VDC
footprint WCAP-ATUL_13x25
pins: 1 N, 2 P

## 860040478014
designator C?, comment 1800uF, 25V
WCAP-ATUL THT Aluminum Electrolytic Capacitors, D13mm x L30mm, 1800uF, +/-20%, 25VDC; Part Number: 860040478014; Dissipation Factor: 14%; Endurance: 10000h; Leakage Current: 450uA; Ripple Current max.: 2640mA; Technical Reference: ATDI300182M025DSPACK000; ComponentLink1Description: Manufacturer; ComponentLink1URL: http://www.we-online.de; ComponentLink2Description: Datasheet; ComponentLink2URL: https://katalog.we-online.com/pbs/datasheet/860040478014.pdf; Length: 30mm; Mounting Technology: THT; Operating Temperature: -40 to +105degC; Packaging: Ammo Pack; Published Date: August 2019; Capacitance: 1800uF; Diameter: 13mm; Publisher: Wurth Elektronik; Capacitance Tolerance: +/-20%; Rated Voltage: 25VDC
footprint WCAP-ATUL_13x30
pins: 1 N, 2 P

## 860040478015
designator C?, comment 2200uF, 25V
WCAP-ATUL THT Aluminum Electrolytic Capacitors, D13mm x L35mm, 2200uF, +/-20%, 25VDC; Part Number: 860040478015; Dissipation Factor: 16%; Endurance: 10000h; Leakage Current: 550uA; Ripple Current max.: 2880mA; Technical Reference: ATDI350222M025DSPABK000; ComponentLink1Description: Manufacturer; ComponentLink1URL: http://www.we-online.de; ComponentLink2Description: Datasheet; ComponentLink2URL: https://katalog.we-online.com/pbs/datasheet/860040478015.pdf; Length: 35mm; Mounting Technology: THT; Operating Temperature: -40 to +105degC; Packaging: Ammo Pack; Published Date: August 2019; Capacitance: 2200uF; Diameter: 13mm; Publisher: Wurth Elektronik; Capacitance Tolerance: +/-20%; Rated Voltage: 25VDC
footprint WCAP-ATUL_13x35
pins: 1 N, 2 P

## 860040480016
designator C?, comment 2700uF, 25V
WCAP-ATUL THT Aluminum Electrolytic Capacitors, D16mm x L25mm, 2700uF, +/-20%, 25VDC; Part Number: 860040480016; Dissipation Factor: 16%; Endurance: 10000h; Leakage Current: 675uA; Ripple Current max.: 2820mA; Technical Reference: ATDK250272M025DSPAEK000; ComponentLink1Description: Manufacturer; ComponentLink1URL: http://www.we-online.de; ComponentLink2Description: Datasheet; ComponentLink2URL: https://katalog.we-online.com/pbs/datasheet/860040480016.pdf; Length: 25mm; Mounting Technology: THT; Operating Temperature: -40 to +105degC; Packaging: Ammo Pack; Published Date: August 2019; Capacitance: 2700uF; Diameter: 16mm; Publisher: Wurth Elektronik; Capacitance Tolerance: +/-20%; Rated Voltage: 25VDC
footprint WCAP-ATUL_16x25
pins: 1 N, 2 P

## 860040572001
designator C?, comment 33uF, 35V
WCAP-ATUL THT Aluminum Electrolytic Capacitors, D5mm x L11mm, 33uF, +/-20%, 35VDC; Part Number: 860040572001; Dissipation Factor: 12%; Endurance: 5000h; Leakage Current: 11.55uA; Ripple Current max.: 230mA; Technical Reference: ATDC110330M035DSPA3E000; ComponentLink1Description: Manufacturer; ComponentLink1URL: http://www.we-online.de; ComponentLink2Description: Datasheet; ComponentLink2URL: https://katalog.we-online.com/pbs/datasheet/860040572001.pdf; Length: 11mm; Mounting Technology: THT; Operating Temperature: -40 to +105degC; Packaging: Ammo Pack; Published Date: August 2019; Capacitance: 33uF; Diameter: 5mm; Publisher: Wurth Elektronik; Capacitance Tolerance: +/-20%; Rated Voltage: 35VDC
footprint WCAP-ATUL_5x11
pins: 1 N, 2 P

## 860040572002
designator C?, comment 47uF, 35V
WCAP-ATUL THT Aluminum Electrolytic Capacitors, D5mm x L11mm, 47uF, +/-20%, 35VDC; Part Number: 860040572002; Dissipation Factor: 12%; Endurance: 5000h; Leakage Current: 16.45uA; Ripple Current max.: 280mA; Technical Reference: ATDC110470M035DSPA3E000; ComponentLink1Description: Manufacturer; ComponentLink1URL: http://www.we-online.de; ComponentLink2Description: Datasheet; ComponentLink2URL: https://katalog.we-online.com/pbs/datasheet/860040572002.pdf; Length: 11mm; Mounting Technology: THT; Operating Temperature: -40 to +105degC; Packaging: Ammo Pack; Published Date: August 2019; Capacitance: 47uF; Diameter: 5mm; Publisher: Wurth Elektronik; Capacitance Tolerance: +/-20%; Rated Voltage: 35VDC
footprint WCAP-ATUL_5x11
pins: 1 N, 2 P

## 860040573003
designator C?, comment 56uF, 35V
WCAP-ATUL THT Aluminum Electrolytic Capacitors, D6.3mm x L11mm, 56uF, +/-20%, 35VDC; Part Number: 860040573003; Dissipation Factor: 12%; Endurance: 5000h; Leakage Current: 19.6uA; Ripple Current max.: 360mA; Technical Reference: ATDD110560M035DSPA4E000; ComponentLink1Description: Manufacturer; ComponentLink1URL: http://www.we-online.de; ComponentLink2Description: Datasheet; ComponentLink2URL: https://katalog.we-online.com/pbs/datasheet/860040573003.pdf; Length: 11mm; Mounting Technology: THT; Operating Temperature: -40 to +105degC; Packaging: Ammo Pack; Published Date: August 2019; Capacitance: 56uF; Diameter: 6.3mm; Publisher: Wurth Elektronik; Capacitance Tolerance: +/-20%; Rated Voltage: 35VDC
footprint WCAP-ATUL_6.3x11
pins: 1 N, 2 P

## 860040573004
designator C?, comment 100uF, 35V
WCAP-ATUL THT Aluminum Electrolytic Capacitors, D6.3mm x L11mm, 100uF, +/-20%, 35VDC; Part Number: 860040573004; Dissipation Factor: 12%; Endurance: 5000h; Leakage Current: 35uA; Ripple Current max.: 450mA; Technical Reference: ATDD110101M035DSPA4E000; ComponentLink1Description: Manufacturer; ComponentLink1URL: http://www.we-online.de; ComponentLink2Description: Datasheet; ComponentLink2URL: https://katalog.we-online.com/pbs/datasheet/860040573004.pdf; Length: 11mm; Mounting Technology: THT; Operating Temperature: -40 to +105degC; Packaging: Ammo Pack; Published Date: August 2019; Capacitance: 100uF; Diameter: 6.3mm; Publisher: Wurth Elektronik; Capacitance Tolerance: +/-20%; Rated Voltage: 35VDC
footprint WCAP-ATUL_6.3x11
pins: 1 N, 2 P

## 860040574005
designator C?, comment 150uF, 35V
WCAP-ATUL THT Aluminum Electrolytic Capacitors, D8mm x L11.5mm, 150uF, +/-20%, 35VDC; Part Number: 860040574005; Dissipation Factor: 12%; Endurance: 7000h; Leakage Current: 52.5uA; Ripple Current max.: 680mA; Technical Reference: ATDE115151M035DSPA7G000; ComponentLink1Description: Manufacturer; ComponentLink1URL: http://www.we-online.de; ComponentLink2Description: Datasheet; ComponentLink2URL: https://katalog.we-online.com/pbs/datasheet/860040574005.pdf; Length: 11.5mm; Mounting Technology: THT; Operating Temperature: -40 to +105degC; Packaging: Ammo Pack; Published Date: August 2019; Capacitance: 150uF; Diameter: 8mm; Publisher: Wurth Elektronik; Capacitance Tolerance: +/-20%; Rated Voltage: 35VDC
footprint WCAP-ATUL_8x11.5
pins: 1 N, 2 P

## 860040574006
designator C?, comment 220uF, 35V
WCAP-ATUL THT Aluminum Electrolytic Capacitors, D8mm x L16mm, 220uF, +/-20%, 35VDC; Part Number: 860040574006; Dissipation Factor: 12%; Endurance: 7000h; Leakage Current: 77uA; Ripple Current max.: 1000mA; Technical Reference: ATDE160221M035DSPA7G000; ComponentLink1Description: Manufacturer; ComponentLink1URL: http://www.we-online.de; ComponentLink2Description: Datasheet; ComponentLink2URL: https://katalog.we-online.com/pbs/datasheet/860040574006.pdf; Length: 16mm; Mounting Technology: THT; Operating Temperature: -40 to +105degC; Packaging: Ammo Pack; Published Date: August 2019; Capacitance: 220uF; Diameter: 8mm; Publisher: Wurth Elektronik; Capacitance Tolerance: +/-20%; Rated Voltage: 35VDC
footprint WCAP-ATUL_8x16
pins: 1 N, 2 P

## 860040574008
designator C?, comment 270uF, 35V
WCAP-ATUL THT Aluminum Electrolytic Capacitors, D8mm x L20mm, 270uF, +/-20%, 35VDC; Part Number: 860040574008; Dissipation Factor: 12%; Endurance: 7000h; Leakage Current: 94.5uA; Ripple Current max.: 1180mA; Technical Reference: ATDE200271M035DSPA7G000; ComponentLink1Description: Manufacturer; ComponentLink1URL: http://www.we-online.de; ComponentLink2Description: Datasheet; ComponentLink2URL: https://katalog.we-online.com/pbs/datasheet/860040574008.pdf; Length: 20mm; Mounting Technology: THT; Operating Temperature: -40 to +105degC; Packaging: Ammo Pack; Published Date: August 2019; Capacitance: 270uF; Diameter: 8mm; Publisher: Wurth Elektronik; Capacitance Tolerance: +/-20%; Rated Voltage: 35VDC
footprint WCAP-ATUL_8x20
pins: 1 N, 2 P

## 860040575007
designator C?, comment 220uF, 35V
WCAP-ATUL THT Aluminum Electrolytic Capacitors, D10mm x L12.5mm, 220uF, +/-20%, 35VDC; Part Number: 860040575007; Dissipation Factor: 12%; Endurance: 7000h; Leakage Current: 77uA; Ripple Current max.: 1060mA; Technical Reference: ATDF125221M035DSPA9G000; ComponentLink1Description: Manufacturer; ComponentLink1URL: http://www.we-online.de; ComponentLink2Description: Datasheet; ComponentLink2URL: https://katalog.we-online.com/pbs/datasheet/860040575007.pdf; Length: 12.5mm; Mounting Technology: THT; Operating Temperature: -40 to +105degC; Packaging: Ammo Pack; Published Date: August 2019; Capacitance: 220uF; Diameter: 10mm; Publisher: Wurth Elektronik; Capacitance Tolerance: +/-20%; Rated Voltage: 35VDC
footprint WCAP-ATUL_10x12.5
pins: 1 N, 2 P
